# Altium schematic symbol library jlcpcb_2025_04_capacitors_extended_0805.schlib: 3281 symbols (part 18 of 18) (continued)
## TCC0805X7R332K251DT
designator C?  Capacitance: 3.3nF  (hidden comment: *)
Capacitor, Ceramic (MLCC), 3.3nF, ±10%, 250V, X7R, ±10%, SMD 0805; Manufacturer: CCTC; Manufacturer Part Number: TCC0805X7R332K251DT; Package Size: 0805; JLCPCB Basic Part: No; JLCPCB Part Number: C282758; Supplier 1: LCSC; Category: Capacitors - MLCC; Supplier Part Number 1: C282758; Tolerance: ±10%; Voltage Rating: 250V; Temperature Coefficient: X7R; RoHS: Yes; ComponentLink1Description: Datasheet; ComponentLink1URL: https://wmsc.lcsc.com/wmsc/upload/file/pdf/v2/lcsc/2304140030_CCTC-TCC0805X7R332K251DT_C282758.pdf; ComponentLink2Description: JLCPCB Part URL; ComponentLink2URL: https://jlcpcb.com/partdetail/C282758; ComponentLink3Description: LCSC Part URL; ComponentLink3URL: https://lcsc.com/product-detail/Multilayer-Ceramic-Capacitors-MLCC---SMD-SMT_CCTC-CCTC-TCC0805X7R332K251DT_C282758.html
footprint CAP-0805 (0805 (2012M) Capacitor)
pins: 1, 2

## TCC0805X7R332K251FT
designator C?  Capacitance: 3.3nF  (hidden comment: *)
Capacitor, Ceramic (MLCC), 3.3nF, ±10%, 250V, X7R, ±10%, SMD 0805; Manufacturer: CCTC; Manufacturer Part Number: TCC0805X7R332K251FT; Package Size: 0805; JLCPCB Basic Part: No; JLCPCB Part Number: C282759; Supplier 1: LCSC; Category: Capacitors - MLCC; Supplier Part Number 1: C282759; Tolerance: ±10%; Voltage Rating: 250V; Temperature Coefficient: X7R; RoHS: Yes; ComponentLink1Description: Datasheet; ComponentLink1URL: https://wmsc.lcsc.com/wmsc/upload/file/pdf/v2/lcsc/2304140030_CCTC-TCC0805X7R332K251FT_C282759.pdf; ComponentLink2Description: JLCPCB Part URL; ComponentLink2URL: https://jlcpcb.com/partdetail/C282759; ComponentLink3Description: LCSC Part URL; ComponentLink3URL: https://lcsc.com/product-detail/Multilayer-Ceramic-Capacitors-MLCC---SMD-SMT_CCTC-CCTC-TCC0805X7R332K251FT_C282759.html
footprint CAP-0805 (0805 (2012M) Capacitor)
pins: 1, 2

## TCC0805X7R332K500DT
designator C?  Capacitance: 3.3nF  (hidden comment: *)
Capacitor, Ceramic (MLCC), 3.3nF, ±10%, 50V, X7R, ±10%, SMD 0805; Manufacturer: CCTC; Manufacturer Part Number: TCC0805X7R332K500DT; Package Size: 0805; JLCPCB Basic Part: No; JLCPCB Part Number: C282760; Supplier 1: LCSC; Category: Capacitors - MLCC; Supplier Part Number 1: C282760; Tolerance: ±10%; Voltage Rating: 50V; Temperature Coefficient: X7R; RoHS: Yes; ComponentLink1Description: Datasheet; ComponentLink1URL: https://wmsc.lcsc.com/wmsc/upload/file/pdf/v2/lcsc/2304140030_CCTC-TCC0805X7R332K500DT_C282760.pdf; ComponentLink2Description: JLCPCB Part URL; ComponentLink2URL: https://jlcpcb.com/partdetail/C282760; ComponentLink3Description: LCSC Part URL; ComponentLink3URL: https://lcsc.com/product-detail/Multilayer-Ceramic-Capacitors-MLCC---SMD-SMT_CCTC-CCTC-TCC0805X7R332K500DT_C282760.html
footprint CAP-0805 (0805 (2012M) Capacitor)
pins: 1, 2

## TCC0805X7R333K500DT
designator C?  Capacitance: 33nF  (hidden comment: *)
Capacitor, Ceramic (MLCC), 33nF, ±10%, 50V, X7R, ±10%, SMD 0805; Manufacturer: CCTC; Manufacturer Part Number: TCC0805X7R333K500DT; Package Size: 0805; JLCPCB Basic Part: No; JLCPCB Part Number: C344201; Supplier 1: LCSC; Category: Capacitors - MLCC; Supplier Part Number 1: C344201; Tolerance: ±10%; Voltage Rating: 50V; Temperature Coefficient: X7R; RoHS: Yes; ComponentLink1Description: Datasheet; ComponentLink1URL: https://wmsc.lcsc.com/wmsc/upload/file/pdf/v2/lcsc/2304140030_CCTC-TCC0805X7R333K500DT_C344201.pdf; ComponentLink2Description: JLCPCB Part URL; ComponentLink2URL: https://jlcpcb.com/partdetail/C344201; ComponentLink3Description: LCSC Part URL; ComponentLink3URL: https://lcsc.com/product-detail/Multilayer-Ceramic-Capacitors-MLCC---SMD-SMT_CCTC-CCTC-TCC0805X7R333K500DT_C344201.html
footprint CAP-0805 (0805 (2012M) Capacitor)
pins: 1, 2

## TCC0805X7R333K500DTS
designator C?  Capacitance: 33nF  (hidden comment: *)
Capacitor, Ceramic (MLCC), 33nF, ±10%, 50V, X7R, ±10%, SMD 0805; Manufacturer: CCTC; Manufacturer Part Number: TCC0805X7R333K500DTS; Package Size: 0805; JLCPCB Basic Part: No; JLCPCB Part Number: C376977; Supplier 1: LCSC; Category: Capacitors - MLCC; Supplier Part Number 1: C376977; Tolerance: ±10%; Voltage Rating: 50V; Temperature Coefficient: X7R; RoHS: Yes; ComponentLink1Description: Datasheet; ComponentLink1URL: https://wmsc.lcsc.com/wmsc/upload/file/pdf/v2/lcsc/2304140030_CCTC-TCC0805X7R333K500DTS_C376977.pdf; ComponentLink2Description: JLCPCB Part URL; ComponentLink2URL: https://jlcpcb.com/partdetail/C376977; ComponentLink3Description: LCSC Part URL; ComponentLink3URL: https://lcsc.com/product-detail/Multilayer-Ceramic-Capacitors-MLCC---SMD-SMT_CCTC-CCTC-TCC0805X7R333K500DTS_C376977.html
footprint CAP-0805 (0805 (2012M) Capacitor)
pins: 1, 2

## TCC0805X7R334K500DT
designator C?  Capacitance: 330nF  (hidden comment: *)
Capacitor, Ceramic (MLCC), 330nF, ±10%, 50V, X7R, ±10%, SMD 0805; Manufacturer: CCTC; Manufacturer Part Number: TCC0805X7R334K500DT; Package Size: 0805; JLCPCB Basic Part: No; JLCPCB Part Number: C309049; Supplier 1: LCSC; Category: Capacitors - MLCC; Supplier Part Number 1: C309049; Tolerance: ±10%; Voltage Rating: 50V; Temperature Coefficient: X7R; RoHS: Yes; ComponentLink1Description: Datasheet; ComponentLink1URL: https://wmsc.lcsc.com/wmsc/upload/file/pdf/v2/lcsc/2304140030_CCTC-TCC0805X7R334K500DT_C309049.pdf; ComponentLink2Description: JLCPCB Part URL; ComponentLink2URL: https://jlcpcb.com/partdetail/C309049; ComponentLink3Description: LCSC Part URL; ComponentLink3URL: https://lcsc.com/product-detail/Multilayer-Ceramic-Capacitors-MLCC---SMD-SMT_CCTC-CCTC-TCC0805X7R334K500DT_C309049.html
footprint CAP-0805 (0805 (2012M) Capacitor)
pins: 1, 2

## TCC0805X7R334K500FT
designator C?  Capacitance: 330000pF  (hidden comment: *)
Capacitor, Ceramic (MLCC), 330000pF, ±10%, 50V, X7R, ±10%, SMD 0805; Manufacturer: CCTC; Manufacturer Part Number: TCC0805X7R334K500FT; Package Size: 0805; JLCPCB Basic Part: No; JLCPCB Part Number: C880614; Supplier 1: LCSC; Category: Capacitors - MLCC; Supplier Part Number 1: C880614; Tolerance: ±10%; Voltage Rating: 50V; Temperature Coefficient: X7R; RoHS: Yes; ComponentLink1Description: Datasheet; ComponentLink1URL: https://wmsc.lcsc.com/wmsc/upload/file/pdf/v2/lcsc/2304140030_CCTC-TCC0805X7R334K500FT_C880614.pdf; ComponentLink2Description: JLCPCB Part URL; ComponentLink2URL: https://jlcpcb.com/partdetail/C880614; ComponentLink3Description: LCSC Part URL; ComponentLink3URL: https://lcsc.com/product-detail/Multilayer-Ceramic-Capacitors-MLCC---SMD-SMT_CCTC-CCTC-TCC0805X7R334K500FT_C880614.html
footprint CAP-0805 (0805 (2012M) Capacitor)
pins: 1, 2

## TCC0805X7R334M500FT
designator C?  Capacitance: 330nF  (hidden comment: *)
Capacitor, Ceramic (MLCC), 330nF, ±20%, 50V, X7R, ±20%, SMD 0805; Manufacturer: CCTC; Manufacturer Part Number: TCC0805X7R334M500FT; Package Size: 0805; JLCPCB Basic Part: No; JLCPCB Part Number: C5375834; Supplier 1: LCSC; Category: Capacitors - MLCC; Supplier Part Number 1: C5375834; Tolerance: ±20%; Voltage Rating: 50V; Temperature Coefficient: X7R; RoHS: Yes; ComponentLink1Description: Datasheet; ComponentLink2Description: JLCPCB Part URL; ComponentLink2URL: https://jlcpcb.com/partdetail/C5375834; ComponentLink3Description: LCSC Part URL; ComponentLink3URL: https://lcsc.com/product-detail/Multilayer-Ceramic-Capacitors-MLCC---SMD-SMT_CCTC-CCTC-TCC0805X7R334M500FT_C5375834.html
footprint CAP-0805 (0805 (2012M) Capacitor)
pins: 1, 2

## TCC0805X7R335K250FT
designator C?  Capacitance: 3.3uF  (hidden comment: *)
Capacitor, Ceramic (MLCC), 3.3uF, ±10%, 25V, X7R, ±10%, SMD 0805; Manufacturer: CCTC; Manufacturer Part Number: TCC0805X7R335K250FT; Package Size: 0805; JLCPCB Basic Part: No; JLCPCB Part Number: C7393948; Supplier 1: LCSC; Category: Capacitors - MLCC; Supplier Part Number 1: C7393948; Tolerance: ±10%; Voltage Rating: 25V; Temperature Coefficient: X7R; RoHS: Yes; ComponentLink1Description: Datasheet; ComponentLink1URL: https://wmsc.lcsc.com/wmsc/upload/file/pdf/v2/lcsc/2306061505_CCTC-TCC0805X7R335K250FT_C7393948.pdf; ComponentLink2Description: JLCPCB Part URL; ComponentLink2URL: https://jlcpcb.com/partdetail/C7393948; ComponentLink3Description: LCSC Part URL; ComponentLink3URL: https://lcsc.com/product-detail/Multilayer-Ceramic-Capacitors-MLCC---SMD-SMT_CCTC-CCTC-TCC0805X7R335K250FT_C7393948.html
footprint CAP-0805 (0805 (2012M) Capacitor)
pins: 1, 2

## TCC0805X7R391K500DT
designator C?  Capacitance: 390pF  (hidden comment: *)
Capacitor, Ceramic (MLCC), 390pF, ±10%, 50V, X7R, ±10%, SMD 0805; Manufacturer: CCTC; Manufacturer Part Number: TCC0805X7R391K500DT; Package Size: 0805; JLCPCB Basic Part: No; JLCPCB Part Number: C376979; Supplier 1: LCSC; Category: Capacitors - MLCC; Supplier Part Number 1: C376979; Tolerance: ±10%; Voltage Rating: 50V; Temperature Coefficient: X7R; RoHS: Yes; ComponentLink1Description: Datasheet; ComponentLink1URL: https://wmsc.lcsc.com/wmsc/upload/file/pdf/v2/lcsc/2304140030_CCTC-TCC0805X7R391K500DT_C376979.pdf; ComponentLink2Description: JLCPCB Part URL; ComponentLink2URL: https://jlcpcb.com/partdetail/C376979; ComponentLink3Description: LCSC Part URL; ComponentLink3URL: https://lcsc.com/product-detail/Multilayer-Ceramic-Capacitors-MLCC---SMD-SMT_CCTC-CCTC-TCC0805X7R391K500DT_C376979.html
footprint CAP-0805 (0805 (2012M) Capacitor)
pins: 1, 2

## TCC0805X7R392K500DT
designator C?  Capacitance: 3.9nF  (hidden comment: *)
Capacitor, Ceramic (MLCC), 3.9nF, ±10%, 50V, X7R, ±10%, SMD 0805; Manufacturer: CCTC; Manufacturer Part Number: TCC0805X7R392K500DT; Package Size: 0805; JLCPCB Basic Part: No; JLCPCB Part Number: C376980; Supplier 1: LCSC; Category: Capacitors - MLCC; Supplier Part Number 1: C376980; Tolerance: ±10%; Voltage Rating: 50V; Temperature Coefficient: X7R; RoHS: Yes; ComponentLink1Description: Datasheet; ComponentLink1URL: https://wmsc.lcsc.com/wmsc/upload/file/pdf/v2/lcsc/2304140030_CCTC-TCC0805X7R392K500DT_C376980.pdf; ComponentLink2Description: JLCPCB Part URL; ComponentLink2URL: https://jlcpcb.com/partdetail/C376980; ComponentLink3Description: LCSC Part URL; ComponentLink3URL: https://lcsc.com/product-detail/Multilayer-Ceramic-Capacitors-MLCC---SMD-SMT_CCTC-CCTC-TCC0805X7R392K500DT_C376980.html
footprint CAP-0805 (0805 (2012M) Capacitor)
pins: 1, 2

## TCC0805X7R393K500DT
designator C?  Capacitance: 39nF  (hidden comment: *)
Capacitor, Ceramic (MLCC), 39nF, ±10%, 50V, X7R, ±10%, SMD 0805; Manufacturer: CCTC; Manufacturer Part Number: TCC0805X7R393K500DT; Package Size: 0805; JLCPCB Basic Part: No; JLCPCB Part Number: C282762; Supplier 1: LCSC; Category: Capacitors - MLCC; Supplier Part Number 1: C282762; Tolerance: ±10%; Voltage Rating: 50V; Temperature Coefficient: X7R; RoHS: Yes; ComponentLink1Description: Datasheet; ComponentLink1URL: https://wmsc.lcsc.com/wmsc/upload/file/pdf/v2/lcsc/2304140030_CCTC-TCC0805X7R393K500DT_C282762.pdf; ComponentLink2Description: JLCPCB Part URL; ComponentLink2URL: https://jlcpcb.com/partdetail/C282762; ComponentLink3Description: LCSC Part URL; ComponentLink3URL: https://lcsc.com/product-detail/Multilayer-Ceramic-Capacitors-MLCC---SMD-SMT_CCTC-CCTC-TCC0805X7R393K500DT_C282762.html
footprint CAP-0805 (0805 (2012M) Capacitor)
pins: 1, 2

## TCC0805X7R471K101DT
designator C?  Capacitance: 470pF  (hidden comment: *)
Capacitor, Ceramic (MLCC), 470pF, ±10%, 100V, X7R, ±10%, SMD 0805; Manufacturer: CCTC; Manufacturer Part Number: TCC0805X7R471K101DT; Package Size: 0805; JLCPCB Basic Part: No; JLCPCB Part Number: C309050; Supplier 1: LCSC; Category: Capacitors - MLCC; Supplier Part Number 1: C309050; Tolerance: ±10%; Voltage Rating: 100V; Temperature Coefficient: X7R; RoHS: Yes; ComponentLink1Description: Datasheet; ComponentLink1URL: https://wmsc.lcsc.com/wmsc/upload/file/pdf/v2/lcsc/2304140030_CCTC-TCC0805X7R471K101DT_C309050.pdf; ComponentLink2Description: JLCPCB Part URL; ComponentLink2URL: https://jlcpcb.com/partdetail/C309050; ComponentLink3Description: LCSC Part URL; ComponentLink3URL: https://lcsc.com/product-detail/Multilayer-Ceramic-Capacitors-MLCC---SMD-SMT_CCTC-CCTC-TCC0805X7R471K101DT_C309050.html
footprint CAP-0805 (0805 (2012M) Capacitor)
pins: 1, 2

## TCC0805X7R471K101FT
designator C?  Capacitance: 470pF  (hidden comment: *)
Capacitor, Ceramic (MLCC), 470pF, ±10%, 100V, X7R, ±10%, SMD 0805; Manufacturer: CCTC; Manufacturer Part Number: TCC0805X7R471K101FT; Package Size: 0805; JLCPCB Basic Part: No; JLCPCB Part Number: C376981; Supplier 1: LCSC; Category: Capacitors - MLCC; Supplier Part Number 1: C376981; Tolerance: ±10%; Voltage Rating: 100V; Temperature Coefficient: X7R; RoHS: Yes; ComponentLink1Description: Datasheet; ComponentLink1URL: https://wmsc.lcsc.com/wmsc/upload/file/pdf/v2/lcsc/2304140030_CCTC-TCC0805X7R471K101FT_C376981.pdf; ComponentLink2Description: JLCPCB Part URL; ComponentLink2URL: https://jlcpcb.com/partdetail/C376981; ComponentLink3Description: LCSC Part URL; ComponentLink3URL: https://lcsc.com/product-detail/Multilayer-Ceramic-Capacitors-MLCC---SMD-SMT_CCTC-CCTC-TCC0805X7R471K101FT_C376981.html
footprint CAP-0805 (0805 (2012M) Capacitor)
pins: 1, 2

## TCC0805X7R471K251DT
designator C?  Capacitance: 470pF  (hidden comment: *)
Capacitor, Ceramic (MLCC), 470pF, ±10%, 250V, X7R, ±10%, SMD 0805; Manufacturer: CCTC; Manufacturer Part Number: TCC0805X7R471K251DT; Package Size: 0805; JLCPCB Basic Part: No; JLCPCB Part Number: C309051; Supplier 1: LCSC; Category: Capacitors - MLCC; Supplier Part Number 1: C309051; Tolerance: ±10%; Voltage Rating: 250V; Temperature Coefficient: X7R; RoHS: Yes; ComponentLink1Description: Datasheet; ComponentLink1URL: https://wmsc.lcsc.com/wmsc/upload/file/pdf/v2/lcsc/2304140030_CCTC-TCC0805X7R471K251DT_C309051.pdf; ComponentLink2Description: JLCPCB Part URL; ComponentLink2URL: https://jlcpcb.com/partdetail/C309051; ComponentLink3Description: LCSC Part URL; ComponentLink3URL: https://lcsc.com/product-detail/Multilayer-Ceramic-Capacitors-MLCC---SMD-SMT_CCTC-CCTC-TCC0805X7R471K251DT_C309051.html
footprint CAP-0805 (0805 (2012M) Capacitor)
pins: 1, 2

## TCC0805X7R471K251FT
designator C?  Capacitance: 470pF  (hidden comment: *)
Capacitor, Ceramic (MLCC), 470pF, ±10%, 250V, X7R, ±10%, SMD 0805; Manufacturer: CCTC; Manufacturer Part Number: TCC0805X7R471K251FT; Package Size: 0805; JLCPCB Basic Part: No; JLCPCB Part Number: C376982; Supplier 1: LCSC; Category: Capacitors - MLCC; Supplier Part Number 1: C376982; Tolerance: ±10%; Voltage Rating: 250V; Temperature Coefficient: X7R; RoHS: Yes; ComponentLink1Description: Datasheet; ComponentLink1URL: https://wmsc.lcsc.com/wmsc/upload/file/pdf/v2/lcsc/2304140030_CCTC-TCC0805X7R471K251FT_C376982.pdf; ComponentLink2Description: JLCPCB Part URL; ComponentLink2URL: https://jlcpcb.com/partdetail/C376982; ComponentLink3Description: LCSC Part URL; ComponentLink3URL: https://lcsc.com/product-detail/Multilayer-Ceramic-Capacitors-MLCC---SMD-SMT_CCTC-CCTC-TCC0805X7R471K251FT_C376982.html
footprint CAP-0805 (0805 (2012M) Capacitor)
pins: 1, 2

## TCC0805X7R471K500BT
designator C?  Capacitance: 470pF  (hidden comment: *)
Capacitor, Ceramic (MLCC), 470pF, ±10%, 50V, X7R, ±10%, SMD 0805; Manufacturer: CCTC; Manufacturer Part Number: TCC0805X7R471K500BT; Package Size: 0805; JLCPCB Basic Part: No; JLCPCB Part Number: C376983; Supplier 1: LCSC; Category: Capacitors - MLCC; Supplier Part Number 1: C376983; Tolerance: ±10%; Voltage Rating: 50V; Temperature Coefficient: X7R; RoHS: Yes; ComponentLink1Description: Datasheet; ComponentLink1URL: https://wmsc.lcsc.com/wmsc/upload/file/pdf/v2/lcsc/2304140030_CCTC-TCC0805X7R471K500BT_C376983.pdf; ComponentLink2Description: JLCPCB Part URL; ComponentLink2URL: https://jlcpcb.com/partdetail/C376983; ComponentLink3Description: LCSC Part URL; ComponentLink3URL: https://lcsc.com/product-detail/Multilayer-Ceramic-Capacitors-MLCC---SMD-SMT_CCTC-CCTC-TCC0805X7R471K500BT_C376983.html
footprint CAP-0805 (0805 (2012M) Capacitor)
pins: 1, 2

## TCC0805X7R471K500DT
designator C?  Capacitance: 470pF  (hidden comment: *)
Capacitor, Ceramic (MLCC), 470pF, ±10%, 50V, X7R, ±10%, SMD 0805; Manufacturer: CCTC; Manufacturer Part Number: TCC0805X7R471K500DT; Package Size: 0805; JLCPCB Basic Part: No; JLCPCB Part Number: C309041; Supplier 1: LCSC; Category: Capacitors - MLCC; Supplier Part Number 1: C309041; Tolerance: ±10%; Voltage Rating: 50V; Temperature Coefficient: X7R; RoHS: Yes; ComponentLink1Description: Datasheet; ComponentLink1URL: https://wmsc.lcsc.com/wmsc/upload/file/pdf/v2/lcsc/2304140030_CCTC-TCC0805X7R471K500DT_C309041.pdf; ComponentLink2Description: JLCPCB Part URL; ComponentLink2URL: https://jlcpcb.com/partdetail/C309041; ComponentLink3Description: LCSC Part URL; ComponentLink3URL: https://lcsc.com/product-detail/Multilayer-Ceramic-Capacitors-MLCC---SMD-SMT_CCTC-CCTC-TCC0805X7R471K500DT_C309041.html
footprint CAP-0805 (0805 (2012M) Capacitor)
pins: 1, 2

## TCC0805X7R471K500DTS
designator C?  Capacitance: 470pF  (hidden comment: *)
Capacitor, Ceramic (MLCC), 470pF, ±10%, 50V, X7R, ±10%, SMD 0805; Manufacturer: CCTC; Manufacturer Part Number: TCC0805X7R471K500DTS; Package Size: 0805; JLCPCB Basic Part: No; JLCPCB Part Number: C376984; Supplier 1: LCSC; Category: Capacitors - MLCC; Supplier Part Number 1: C376984; Tolerance: ±10%; Voltage Rating: 50V; Temperature Coefficient: X7R; RoHS: Yes; ComponentLink1Description: Datasheet; ComponentLink1URL: https://wmsc.lcsc.com/wmsc/upload/file/pdf/v2/lcsc/2304140030_CCTC-TCC0805X7R471K500DTS_C376984.pdf; ComponentLink2Description: JLCPCB Part URL; ComponentLink2URL: https://jlcpcb.com/partdetail/C376984; ComponentLink3Description: LCSC Part URL; ComponentLink3URL: https://lcsc.com/product-detail/Multilayer-Ceramic-Capacitors-MLCC---SMD-SMT_CCTC-CCTC-TCC0805X7R471K500DTS_C376984.html
footprint CAP-0805 (0805 (2012M) Capacitor)
pins: 1, 2

## TCC0805X7R471K501DT
designator C?  Capacitance: 470pF  (hidden comment: *)
Capacitor, Ceramic (MLCC), 470pF, ±10%, 500V, X7R, ±10%, SMD 0805; Manufacturer: CCTC; Manufacturer Part Number: TCC0805X7R471K501DT; Package Size: 0805; JLCPCB Basic Part: No; JLCPCB Part Number: C344196; Supplier 1: LCSC; Category: Capacitors - MLCC; Supplier Part Number 1: C344196; Tolerance: ±10%; Voltage Rating: 500V; Temperature Coefficient: X7R; RoHS: Yes; ComponentLink1Description: Datasheet; ComponentLink1URL: https://wmsc.lcsc.com/wmsc/upload/file/pdf/v2/lcsc/2304140030_CCTC-TCC0805X7R471K501DT_C344196.pdf; ComponentLink2Description: JLCPCB Part URL; ComponentLink2URL: https://jlcpcb.com/partdetail/C344196; ComponentLink3Description: LCSC Part URL; ComponentLink3URL: https://lcsc.com/product-detail/Multilayer-Ceramic-Capacitors-MLCC---SMD-SMT_CCTC-CCTC-TCC0805X7R471K501DT_C344196.html
footprint CAP-0805 (0805 (2012M) Capacitor)
pins: 1, 2

## TCC0805X7R471K501FT
designator C?  Capacitance: 470pF  (hidden comment: *)
Capacitor, Ceramic (MLCC), 470pF, ±10%, 500V, X7R, ±10%, SMD 0805; Manufacturer: CCTC; Manufacturer Part Number: TCC0805X7R471K501FT; Package Size: 0805; JLCPCB Basic Part: No; JLCPCB Part Number: C376985; Supplier 1: LCSC; Category: Capacitors - MLCC; Supplier Part Number 1: C376985; Tolerance: ±10%; Voltage Rating: 500V; Temperature Coefficient: X7R; RoHS: Yes; ComponentLink1Description: Datasheet; ComponentLink1URL: https://wmsc.lcsc.com/wmsc/upload/file/pdf/v2/lcsc/2304140030_CCTC-TCC0805X7R471K501FT_C376985.pdf; ComponentLink2Description: JLCPCB Part URL; ComponentLink2URL: https://jlcpcb.com/partdetail/C376985; ComponentLink3Description: LCSC Part URL; ComponentLink3URL: https://lcsc.com/product-detail/Multilayer-Ceramic-Capacitors-MLCC---SMD-SMT_CCTC-CCTC-TCC0805X7R471K501FT_C376985.html
footprint CAP-0805 (0805 (2012M) Capacitor)
pins: 1, 2

## TCC0805X7R472J500DT
designator C?  Capacitance: 4.7nF  (hidden comment: *)
Capacitor, Ceramic (MLCC), 4.7nF, ±5%, 50V, X7R, ±5%, SMD 0805; Manufacturer: CCTC; Manufacturer Part Number: TCC0805X7R472J500DT; Package Size: 0805; JLCPCB Basic Part: No; JLCPCB Part Number: C376986; Supplier 1: LCSC; Category: Capacitors - MLCC; Supplier Part Number 1: C376986; Tolerance: ±5%; Voltage Rating: 50V; Temperature Coefficient: X7R; RoHS: Yes; ComponentLink1Description: Datasheet; ComponentLink1URL: https://wmsc.lcsc.com/wmsc/upload/file/pdf/v2/lcsc/2304140030_CCTC-TCC0805X7R472J500DT_C376986.pdf; ComponentLink2Description: JLCPCB Part URL; ComponentLink2URL: https://jlcpcb.com/partdetail/C376986; ComponentLink3Description: LCSC Part URL; ComponentLink3URL: https://lcsc.com/product-detail/Multilayer-Ceramic-Capacitors-MLCC---SMD-SMT_CCTC-CCTC-TCC0805X7R472J500DT_C376986.html
footprint CAP-0805 (0805 (2012M) Capacitor)
pins: 1, 2

## TCC0805X7R472K101DT
designator C?  Capacitance: 4.7nF  (hidden comment: *)
Capacitor, Ceramic (MLCC), 4.7nF, ±10%, 100V, X7R, ±10%, SMD 0805; Manufacturer: CCTC; Manufacturer Part Number: TCC0805X7R472K101DT; Package Size: 0805; JLCPCB Basic Part: No; JLCPCB Part Number: C344200; Supplier 1: LCSC; Category: Capacitors - MLCC; Supplier Part Number 1: C344200; Tolerance: ±10%; Voltage Rating: 100V; Temperature Coefficient: X7R; RoHS: Yes; ComponentLink1Description: Datasheet; ComponentLink1URL: https://wmsc.lcsc.com/wmsc/upload/file/pdf/v2/lcsc/2304140030_CCTC-TCC0805X7R472K101DT_C344200.pdf; ComponentLink2Description: JLCPCB Part URL; ComponentLink2URL: https://jlcpcb.com/partdetail/C344200; ComponentLink3Description: LCSC Part URL; ComponentLink3URL: https://lcsc.com/product-detail/Multilayer-Ceramic-Capacitors-MLCC---SMD-SMT_CCTC-CCTC-TCC0805X7R472K101DT_C344200.html
footprint CAP-0805 (0805 (2012M) Capacitor)
pins: 1, 2

## TCC0805X7R472K251DT
designator C?  Capacitance: 4.7nF  (hidden comment: *)
Capacitor, Ceramic (MLCC), 4.7nF, ±10%, 250V, X7R, ±10%, SMD 0805; Manufacturer: CCTC; Manufacturer Part Number: TCC0805X7R472K251DT; Package Size: 0805; JLCPCB Basic Part: No; JLCPCB Part Number: C282764; Supplier 1: LCSC; Category: Capacitors - MLCC; Supplier Part Number 1: C282764; Tolerance: ±10%; Voltage Rating: 250V; Temperature Coefficient: X7R; RoHS: Yes; ComponentLink1Description: Datasheet; ComponentLink1URL: https://wmsc.lcsc.com/wmsc/upload/file/pdf/v2/lcsc/2304140030_CCTC-TCC0805X7R472K251DT_C282764.pdf; ComponentLink2Description: JLCPCB Part URL; ComponentLink2URL: https://jlcpcb.com/partdetail/C282764; ComponentLink3Description: LCSC Part URL; ComponentLink3URL: https://lcsc.com/product-detail/Multilayer-Ceramic-Capacitors-MLCC---SMD-SMT_CCTC-CCTC-TCC0805X7R472K251DT_C282764.html
footprint CAP-0805 (0805 (2012M) Capacitor)
pins: 1, 2

## TCC0805X7R472K251FT
designator C?  Capacitance: 4.7nF  (hidden comment: *)
Capacitor, Ceramic (MLCC), 4.7nF, ±10%, 250V, X7R, ±10%, SMD 0805; Manufacturer: CCTC; Manufacturer Part Number: TCC0805X7R472K251FT; Package Size: 0805; JLCPCB Basic Part: No; JLCPCB Part Number: C282765; Supplier 1: LCSC; Category: Capacitors - MLCC; Supplier Part Number 1: C282765; Tolerance: ±10%; Voltage Rating: 250V; Temperature Coefficient: X7R; RoHS: Yes; ComponentLink1Description: Datasheet; ComponentLink1URL: https://wmsc.lcsc.com/wmsc/upload/file/pdf/v2/lcsc/2304140030_CCTC-TCC0805X7R472K251FT_C282765.pdf; ComponentLink2Description: JLCPCB Part URL; ComponentLink2URL: https://jlcpcb.com/partdetail/C282765; ComponentLink3Description: LCSC Part URL; ComponentLink3URL: https://lcsc.com/product-detail/Multilayer-Ceramic-Capacitors-MLCC---SMD-SMT_CCTC-CCTC-TCC0805X7R472K251FT_C282765.html
footprint CAP-0805 (0805 (2012M) Capacitor)
pins: 1, 2

## TCC0805X7R472K500DT
designator C?  Capacitance: 4.7nF  (hidden comment: *)
Capacitor, Ceramic (MLCC), 4.7nF, ±10%, 50V, X7R, ±10%, SMD 0805; Manufacturer: CCTC; Manufacturer Part Number: TCC0805X7R472K500DT; Package Size: 0805; JLCPCB Basic Part: No; JLCPCB Part Number: C282766; Supplier 1: LCSC; Category: Capacitors - MLCC; Supplier Part Number 1: C282766; Tolerance: ±10%; Voltage Rating: 50V; Temperature Coefficient: X7R; RoHS: Yes; ComponentLink1Description: Datasheet; ComponentLink1URL: https://wmsc.lcsc.com/wmsc/upload/file/pdf/v2/lcsc/2304140030_CCTC-TCC0805X7R472K500DT_C282766.pdf; ComponentLink2Description: JLCPCB Part URL; ComponentLink2URL: https://jlcpcb.com/partdetail/C282766; ComponentLink3Description: LCSC Part URL; ComponentLink3URL: https://lcsc.com/product-detail/Multilayer-Ceramic-Capacitors-MLCC---SMD-SMT_CCTC-CCTC-TCC0805X7R472K500DT_C282766.html
footprint CAP-0805 (0805 (2012M) Capacitor)
pins: 1, 2

## TCC0805X7R472K500DTS
designator C?  Capacitance: 4.7nF  (hidden comment: *)
Capacitor, Ceramic (MLCC), 4.7nF, ±10%, 50V, X7R, ±10%, SMD 0805; Manufacturer: CCTC; Manufacturer Part Number: TCC0805X7R472K500DTS; Package Size: 0805; JLCPCB Basic Part: No; JLCPCB Part Number: C880654; Supplier 1: LCSC; Category: Capacitors - MLCC; Supplier Part Number 1: C880654; Tolerance: ±10%; Voltage Rating: 50V; Temperature Coefficient: X7R; RoHS: Yes; ComponentLink1Description: Datasheet; ComponentLink1URL: https://wmsc.lcsc.com/wmsc/upload/file/pdf/v2/lcsc/2306211557_CCTC-TCC0805X7R472K500DTS_C880654.pdf; ComponentLink2Description: JLCPCB Part URL; ComponentLink2URL: https://jlcpcb.com/partdetail/C880654; ComponentLink3Description: LCSC Part URL; ComponentLink3URL: https://lcsc.com/product-detail/Multilayer-Ceramic-Capacitors-MLCC---SMD-SMT_CCTC-CCTC-TCC0805X7R472K500DTS_C880654.html
footprint CAP-0805 (0805 (2012M) Capacitor)
pins: 1, 2

## TCC0805X7R472K501FT
designator C?  Capacitance: 4.7nF  (hidden comment: *)
Capacitor, Ceramic (MLCC), 4.7nF, ±10%, 500V, X7R, ±10%, SMD 0805; Manufacturer: CCTC; Manufacturer Part Number: TCC0805X7R472K501FT; Package Size: 0805; JLCPCB Basic Part: No; JLCPCB Part Number: C282767; Supplier 1: LCSC; Category: Capacitors - MLCC; Supplier Part Number 1: C282767; Tolerance: ±10%; Voltage Rating: 500V; Temperature Coefficient: X7R; RoHS: Yes; ComponentLink1Description: Datasheet; ComponentLink1URL: https://wmsc.lcsc.com/wmsc/upload/file/pdf/v2/lcsc/2304140030_CCTC-TCC0805X7R472K501FT_C282767.pdf; ComponentLink2Description: JLCPCB Part URL; ComponentLink2URL: https://jlcpcb.com/partdetail/C282767; ComponentLink3Description: LCSC Part URL; ComponentLink3URL: https://lcsc.com/product-detail/Multilayer-Ceramic-Capacitors-MLCC---SMD-SMT_CCTC-CCTC-TCC0805X7R472K501FT_C282767.html
footprint CAP-0805 (0805 (2012M) Capacitor)
pins: 1, 2

## TCC0805X7R473K101DT
designator C?  Capacitance: 47nF  (hidden comment: *)
Capacitor, Ceramic (MLCC), 47nF, ±10%, 100V, X7R, ±10%, SMD 0805; Manufacturer: CCTC; Manufacturer Part Number: TCC0805X7R473K101DT; Package Size: 0805; JLCPCB Basic Part: No; JLCPCB Part Number: C376987; Supplier 1: LCSC; Category: Capacitors - MLCC; Supplier Part Number 1: C376987; Tolerance: ±10%; Voltage Rating: 100V; Temperature Coefficient: X7R; RoHS: Yes; ComponentLink1Description: Datasheet; ComponentLink1URL: https://wmsc.lcsc.com/wmsc/upload/file/pdf/v2/lcsc/2304140030_CCTC-TCC0805X7R473K101DT_C376987.pdf; ComponentLink2Description: JLCPCB Part URL; ComponentLink2URL: https://jlcpcb.com/partdetail/C376987; ComponentLink3Description: LCSC Part URL; ComponentLink3URL: https://lcsc.com/product-detail/Multilayer-Ceramic-Capacitors-MLCC---SMD-SMT_CCTC-CCTC-TCC0805X7R473K101DT_C376987.html
footprint CAP-0805 (0805 (2012M) Capacitor)
pins: 1, 2

## TCC0805X7R473K101FT
designator C?  Capacitance: 47nF  (hidden comment: *)
Capacitor, Ceramic (MLCC), 47nF, ±10%, 100V, X7R, ±10%, SMD 0805; Manufacturer: CCTC; Manufacturer Part Number: TCC0805X7R473K101FT; Package Size: 0805; JLCPCB Basic Part: No; JLCPCB Part Number: C282768; Supplier 1: LCSC; Category: Capacitors - MLCC; Supplier Part Number 1: C282768; Tolerance: ±10%; Voltage Rating: 100V; Temperature Coefficient: X7R; RoHS: Yes; ComponentLink1Description: Datasheet; ComponentLink1URL: https://wmsc.lcsc.com/wmsc/upload/file/pdf/v2/lcsc/2304140030_CCTC-TCC0805X7R473K101FT_C282768.pdf; ComponentLink2Description: JLCPCB Part URL; ComponentLink2URL: https://jlcpcb.com/partdetail/C282768; ComponentLink3Description: LCSC Part URL; ComponentLink3URL: https://lcsc.com/product-detail/Multilayer-Ceramic-Capacitors-MLCC---SMD-SMT_CCTC-CCTC-TCC0805X7R473K101FT_C282768.html
footprint CAP-0805 (0805 (2012M) Capacitor)
pins: 1, 2

## TCC0805X7R473K251DT
designator C?  Capacitance: 47nF  (hidden comment: *)
Capacitor, Ceramic (MLCC), 47nF, ±10%, 250V, X7R, ±10%, SMD 0805; Manufacturer: CCTC; Manufacturer Part Number: TCC0805X7R473K251DT; Package Size: 0805; JLCPCB Basic Part: No; JLCPCB Part Number: C7393958; Supplier 1: LCSC; Category: Capacitors - MLCC; Supplier Part Number 1: C7393958; Tolerance: ±10%; Voltage Rating: 250V; Temperature Coefficient: X7R; RoHS: Yes; ComponentLink1Description: Datasheet; ComponentLink1URL: https://wmsc.lcsc.com/wmsc/upload/file/pdf/v2/lcsc/2306211555_CCTC-TCC0805X7R473K251DT_C7393958.pdf; ComponentLink2Description: JLCPCB Part URL; ComponentLink2URL: https://jlcpcb.com/partdetail/C7393958; ComponentLink3Description: LCSC Part URL; ComponentLink3URL: https://lcsc.com/product-detail/Multilayer-Ceramic-Capacitors-MLCC---SMD-SMT_CCTC-CCTC-TCC0805X7R473K251DT_C7393958.html
footprint CAP-0805 (0805 (2012M) Capacitor)
pins: 1, 2

## TCC0805X7R473K251FT
designator C?  Capacitance: 47nF  (hidden comment: *)
Capacitor, Ceramic (MLCC), 47nF, ±10%, 250V, X7R, ±10%, SMD 0805; Manufacturer: CCTC; Manufacturer Part Number: TCC0805X7R473K251FT; Package Size: 0805; JLCPCB Basic Part: No; JLCPCB Part Number: C282769; Supplier 1: LCSC; Category: Capacitors - MLCC; Supplier Part Number 1: C282769; Tolerance: ±10%; Voltage Rating: 250V; Temperature Coefficient: X7R; RoHS: Yes; ComponentLink1Description: Datasheet; ComponentLink1URL: https://wmsc.lcsc.com/wmsc/upload/file/pdf/v2/lcsc/2304140030_CCTC-TCC0805X7R473K251FT_C282769.pdf; ComponentLink2Description: JLCPCB Part URL; ComponentLink2URL: https://jlcpcb.com/partdetail/C282769; ComponentLink3Description: LCSC Part URL; ComponentLink3URL: https://lcsc.com/product-detail/Multilayer-Ceramic-Capacitors-MLCC---SMD-SMT_CCTC-CCTC-TCC0805X7R473K251FT_C282769.html
footprint CAP-0805 (0805 (2012M) Capacitor)
pins: 1, 2

## TCC0805X7R473K500DT
designator C?  Capacitance: 47nF  (hidden comment: *)
Capacitor, Ceramic (MLCC), 47nF, ±10%, 50V, X7R, ±10%, SMD 0805; Manufacturer: CCTC; Manufacturer Part Number: TCC0805X7R473K500DT; Package Size: 0805; JLCPCB Basic Part: No; JLCPCB Part Number: C282770; Supplier 1: LCSC; Category: Capacitors - MLCC; Supplier Part Number 1: C282770; Tolerance: ±10%; Voltage Rating: 50V; Temperature Coefficient: X7R; RoHS: Yes; ComponentLink1Description: Datasheet; ComponentLink1URL: https://wmsc.lcsc.com/wmsc/upload/file/pdf/v2/lcsc/2304140030_CCTC-TCC0805X7R473K500DT_C282770.pdf; ComponentLink2Description: JLCPCB Part URL; ComponentLink2URL: https://jlcpcb.com/partdetail/C282770; ComponentLink3Description: LCSC Part URL; ComponentLink3URL: https://lcsc.com/product-detail/Multilayer-Ceramic-Capacitors-MLCC---SMD-SMT_CCTC-CCTC-TCC0805X7R473K500DT_C282770.html
footprint CAP-0805 (0805 (2012M) Capacitor)
pins: 1, 2

## TCC0805X7R473K500DTS
designator C?  Capacitance: 47nF  (hidden comment: *)
Capacitor, Ceramic (MLCC), 47nF, ±10%, 50V, X7R, ±10%, SMD 0805; Manufacturer: CCTC; Manufacturer Part Number: TCC0805X7R473K500DTS; Package Size: 0805; JLCPCB Basic Part: No; JLCPCB Part Number: C376988; Supplier 1: LCSC; Category: Capacitors - MLCC; Supplier Part Number 1: C376988; Tolerance: ±10%; Voltage Rating: 50V; Temperature Coefficient: X7R; RoHS: Yes; ComponentLink1Description: Datasheet; ComponentLink1URL: https://wmsc.lcsc.com/wmsc/upload/file/pdf/v2/lcsc/2304140030_CCTC-TCC0805X7R473K500DTS_C376988.pdf; ComponentLink2Description: JLCPCB Part URL; ComponentLink2URL: https://jlcpcb.com/partdetail/C376988; ComponentLink3Description: LCSC Part URL; ComponentLink3URL: https://lcsc.com/product-detail/Multilayer-Ceramic-Capacitors-MLCC---SMD-SMT_CCTC-CCTC-TCC0805X7R473K500DTS_C376988.html
footprint CAP-0805 (0805 (2012M) Capacitor)
pins: 1, 2

## TCC0805X7R473M500DT
designator C?  Capacitance: 47nF  (hidden comment: *)
Capacitor, Ceramic (MLCC), 47nF, ±20%, 50V, X7R, ±20%, SMD 0805; Manufacturer: CCTC; Manufacturer Part Number: TCC0805X7R473M500DT; Package Size: 0805; JLCPCB Basic Part: No; JLCPCB Part Number: C376989; Supplier 1: LCSC; Category: Capacitors - MLCC; Supplier Part Number 1: C376989; Tolerance: ±20%; Voltage Rating: 50V; Temperature Coefficient: X7R; RoHS: Yes; ComponentLink1Description: Datasheet; ComponentLink1URL: https://wmsc.lcsc.com/wmsc/upload/file/pdf/v2/lcsc/2304140030_CCTC-TCC0805X7R473M500DT_C376989.pdf; ComponentLink2Description: JLCPCB Part URL; ComponentLink2URL: https://jlcpcb.com/partdetail/C376989; ComponentLink3Description: LCSC Part URL; ComponentLink3URL: https://lcsc.com/product-detail/Multilayer-Ceramic-Capacitors-MLCC---SMD-SMT_CCTC-CCTC-TCC0805X7R473M500DT_C376989.html
footprint CAP-0805 (0805 (2012M) Capacitor)
pins: 1, 2

## TCC0805X7R474K250DT
designator C?  Capacitance: 470nF  (hidden comment: *)
Capacitor, Ceramic (MLCC), 470nF, ±10%, 25V, X7R, ±10%, SMD 0805; Manufacturer: CCTC; Manufacturer Part Number: TCC0805X7R474K250DT; Package Size: 0805; JLCPCB Basic Part: No; JLCPCB Part Number: C376992; Supplier 1: LCSC; Category: Capacitors - MLCC; Supplier Part Number 1: C376992; Tolerance: ±10%; Voltage Rating: 25V; Temperature Coefficient: X7R; RoHS: Yes; ComponentLink1Description: Datasheet; ComponentLink1URL: https://wmsc.lcsc.com/wmsc/upload/file/pdf/v2/lcsc/2304140030_CCTC-TCC0805X7R474K250DT_C376992.pdf; ComponentLink2Description: JLCPCB Part URL; ComponentLink2URL: https://jlcpcb.com/partdetail/C376992; ComponentLink3Description: LCSC Part URL; ComponentLink3URL: https://lcsc.com/product-detail/Multilayer-Ceramic-Capacitors-MLCC---SMD-SMT_CCTC-CCTC-TCC0805X7R474K250DT_C376992.html
footprint CAP-0805 (0805 (2012M) Capacitor)
pins: 1, 2

## TCC0805X7R474K500DT
designator C?  Capacitance: 470nF  (hidden comment: *)
Capacitor, Ceramic (MLCC), 470nF, ±10%, 50V, X7R, ±10%, SMD 0805; Manufacturer: CCTC; Manufacturer Part Number: TCC0805X7R474K500DT; Package Size: 0805; JLCPCB Basic Part: No; JLCPCB Part Number: C376993; Supplier 1: LCSC; Category: Capacitors - MLCC; Supplier Part Number 1: C376993; Tolerance: ±10%; Voltage Rating: 50V; Temperature Coefficient: X7R; RoHS: Yes; ComponentLink1Description: Datasheet; ComponentLink1URL: https://wmsc.lcsc.com/wmsc/upload/file/pdf/v2/lcsc/2304140030_CCTC-TCC0805X7R474K500DT_C376993.pdf; ComponentLink2Description: JLCPCB Part URL; ComponentLink2URL: https://jlcpcb.com/partdetail/C376993; ComponentLink3Description: LCSC Part URL; ComponentLink3URL: https://lcsc.com/product-detail/Multilayer-Ceramic-Capacitors-MLCC---SMD-SMT_CCTC-CCTC-TCC0805X7R474K500DT_C376993.html
footprint CAP-0805 (0805 (2012M) Capacitor)
pins: 1, 2

## TCC0805X7R474K500FT
designator C?  Capacitance: 470nF  (hidden comment: *)
Capacitor, Ceramic (MLCC), 470nF, ±10%, 50V, X7R, ±10%, SMD 0805; Manufacturer: CCTC; Manufacturer Part Number: TCC0805X7R474K500FT; Package Size: 0805; JLCPCB Basic Part: No; JLCPCB Part Number: C376994; Supplier 1: LCSC; Category: Capacitors - MLCC; Supplier Part Number 1: C376994; Tolerance: ±10%; Voltage Rating: 50V; Temperature Coefficient: X7R; RoHS: Yes; ComponentLink1Description: Datasheet; ComponentLink1URL: https://wmsc.lcsc.com/wmsc/upload/file/pdf/v2/lcsc/2304140030_CCTC-TCC0805X7R474K500FT_C376994.pdf; ComponentLink2Description: JLCPCB Part URL; ComponentLink2URL: https://jlcpcb.com/partdetail/C376994; ComponentLink3Description: LCSC Part URL; ComponentLink3URL: https://lcsc.com/product-detail/Multilayer-Ceramic-Capacitors-MLCC---SMD-SMT_CCTC-CCTC-TCC0805X7R474K500FT_C376994.html
footprint CAP-0805 (0805 (2012M) Capacitor)
pins: 1, 2

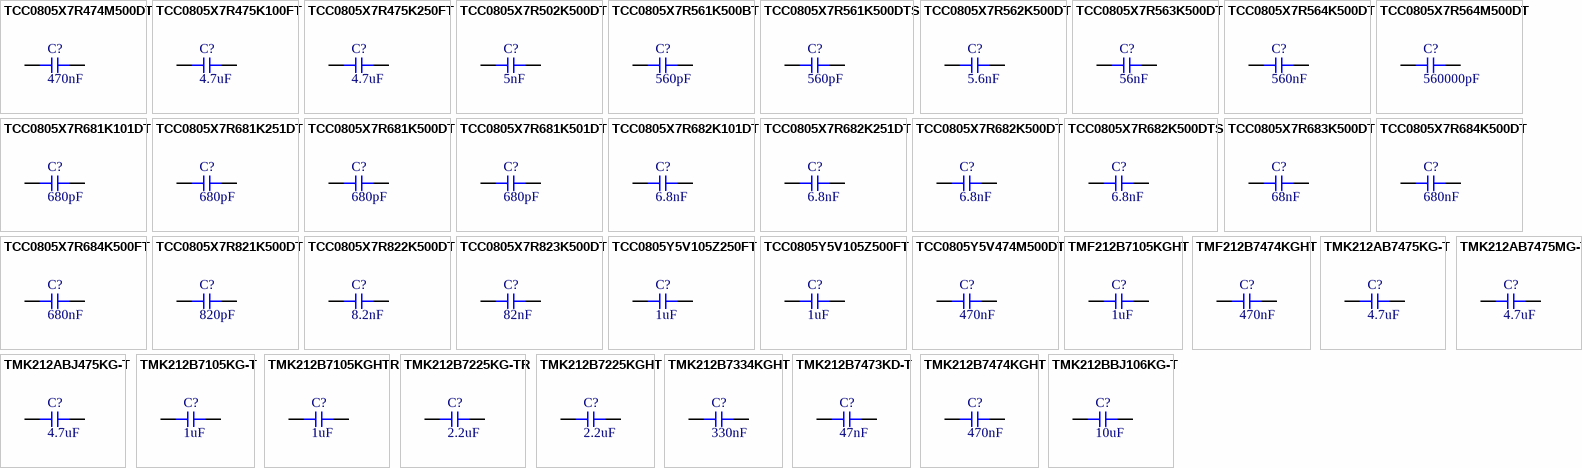
[diagram p80: symbols TCC0805X7R474M500DT to TMK212BBJ106KG-T]

## TCC0805X7R474M500DT
designator C?  Capacitance: 470nF  (hidden comment: *)
Capacitor, Ceramic (MLCC), 470nF, ±20%, 50V, X7R, ±20%, SMD 0805; Manufacturer: CCTC; Manufacturer Part Number: TCC0805X7R474M500DT; Package Size: 0805; JLCPCB Basic Part: No; JLCPCB Part Number: C2904126; Supplier 1: LCSC; Category: Capacitors - MLCC; Supplier Part Number 1: C2904126; Tolerance: ±20%; Voltage Rating: 50V; Temperature Coefficient: X7R; RoHS: Yes; ComponentLink1Description: Datasheet; ComponentLink1URL: https://wmsc.lcsc.com/wmsc/upload/file/pdf/v2/lcsc/2201121200_CCTC-TCC0805X7R474M500DT_C2904126.pdf; ComponentLink2Description: JLCPCB Part URL; ComponentLink2URL: https://jlcpcb.com/partdetail/C2904126; ComponentLink3Description: LCSC Part URL; ComponentLink3URL: https://lcsc.com/product-detail/Multilayer-Ceramic-Capacitors-MLCC---SMD-SMT_CCTC-CCTC-TCC0805X7R474M500DT_C2904126.html
footprint CAP-0805 (0805 (2012M) Capacitor)
pins: 1, 2
